# Altium footprint library DrPCB.PcbLib: 910 footprints (part 14 of 57)
Each footprint in its own frame and in the unit in brackets; x right, y up, seen from the top. Pads: shape width x height; smd on the part's side, far side on the other; paste and mask are expansions set on the pad; w line width, h text height; cw(c..) or ccw(c..) is an arc to the next point about the centre after c.
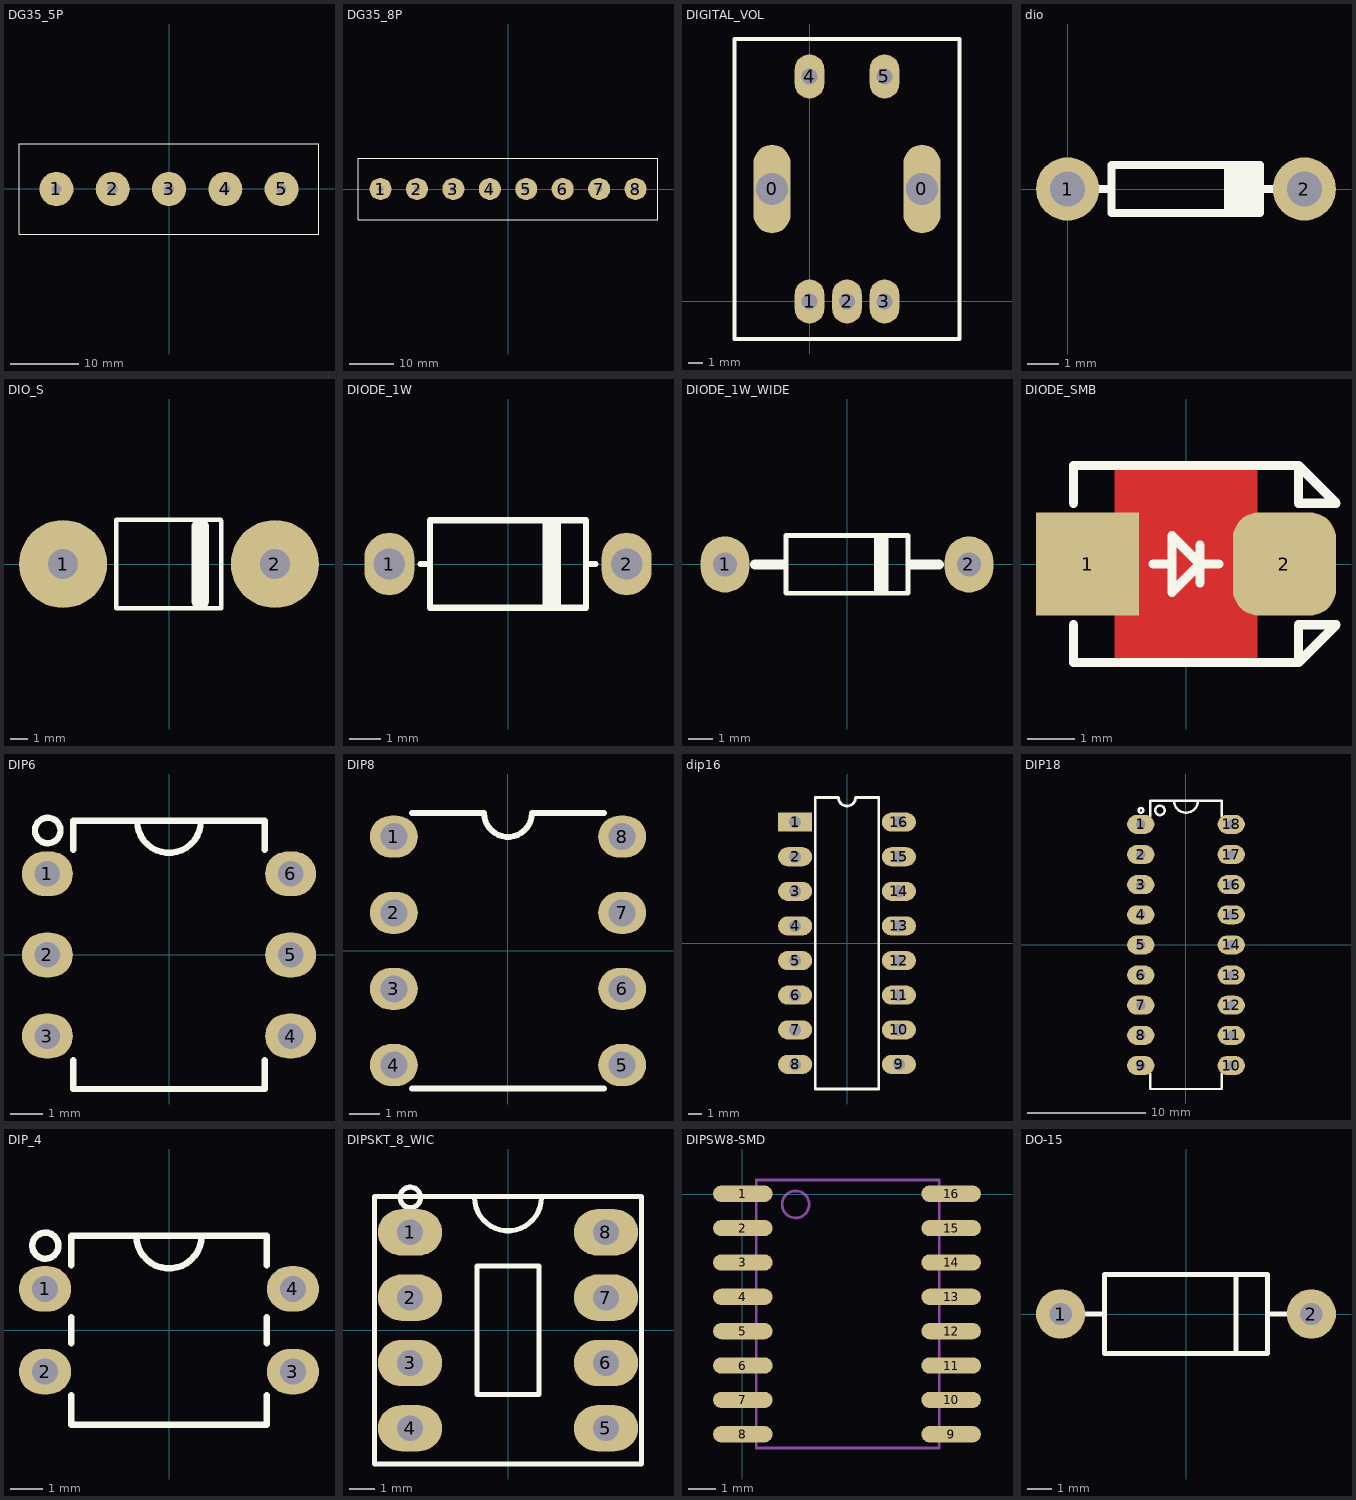
[diagram p13: the footprints below, top view; thin cyan lines are the x and y axes]

## DG35_5P [mm]
pads (5):
  round 5 hole 1.45: 1(-16.5,0) 2(-8.25,0) 3(0,0) 4(8.25,0) 5(16.5,0)
Top Overlay:
  lines w0.15: -21.976,-6.65 21.974,-6.65 21.974,6.642 ; -21.975,-6.65 -21.975,6.642 21.975,6.642
3D body "KF35.STEP": height 14.81, standoff -3.99, extent 3.196,-6.9 21.508,6.9
3D body "KF35.STEP": height 14.81, standoff -3.99, extent -5.054,-6.9 13.258,6.9
3D body "KF35.STEP": height 14.81, standoff -3.99, extent -21.531,-6.9 -3.219,6.9

## DG35_8P [mm]
pads (8):
  round 5 hole 1.45: 1(-28.879,0) 2(-20.629,0) 3(-12.379,0) 4(-4.129,0) 5(4.121,0) 6(12.379,0) 7(20.629,0) 8(28.879,0)
Top Overlay:
  lines w0.15: -33.981,-6.972 33.964,-6.972 33.964,6.985 -33.981,6.985 -33.981,-6.972
3D body "KF35.STEP": height 14.81, standoff -3.99, extent -33.91,-6.9 -15.598,6.9
3D body "KF35.STEP": height 14.81, standoff -3.99, extent -17.433,-6.9 0.88,6.9
3D body "KF35.STEP": height 14.81, standoff -3.99, extent -9.183,-6.9 9.13,6.9
3D body "KF35.STEP": height 14.81, standoff -3.99, extent 15.575,-6.9 33.887,6.9
3D body "KF35.STEP": height 14.81, standoff -3.99, extent -0.902,-6.9 17.41,6.9

## DIGITAL_VOL [mm]
pads (7):
  oval 2.5x6 hole 2.2: 0(-2.54,7.62) 0(7.62,7.62)
  oval 2x3 hole 1.1: 1(0,0) 2(2.54,0) 3(5.08,0) 4(0,15.24) 5(5.08,15.24)
Top Overlay:
  lines w0.254: -5.08,-2.54 -5.08,17.78 10.16,17.78 10.16,-2.54 -5.08,-2.54

## dio [mm]
pads (2):
  round 2 hole 1.1: 1(0,0) 2(7.5,0)
Top Overlay:
  lines w0.254: 0.762,0 1.397,0 1.397,0.762 6.096,0.762 6.096,-0.762 1.397,-0.762 1.397,0.127 ; 5.08,-0.762 5.08,0.762 ; 5.207,-0.762 5.207,0.762 ; 5.334,-0.762 5.334,0.762 ; 5.588,-0.635 5.588,0.762 ; 5.842,0.508 5.842,-0.762 5.842,0.762 ; 6.096,0 6.731,0

## DIO_S [mm]
pads (2):
  round 5 hole 1.7: 1(-6,0) 2(6,0)
Top Overlay:
  lines w0.254: -3,-2.5 2.972,-2.5 2.972,2.462 2.934,2.5 -3,2.5 -3,-2.459
  lines w1: 1.778,-2.095 1.778,2.108

## DIODE_1W [mm] "DIODE 0.3 INCH SPACING 1W, 1N4001"
pads (2):
  oval 1.6x2 hole 1: 1(-3.8,0) 2(3.8,0)
Top Overlay:
  rectangle: 1.1,-1.4 1.7,1.4
  lines w0.2: -2.8,0 -2.5,0 ; 2.5,0 2.8,0 ; -2.5,-1.4 -2.5,1.4 2.5,1.4 2.5,-1.4 -2.5,-1.4
3D body "Zener 1W.STEP": height 3.03, standoff -1.3, extent -4.216,-1.333 4.191,1.334

## DIODE_1W_WIDE [mm] "DIODE 0.3 INCH SPACING 1W, 1N4001"
pads (2):
  oval 2x2.3 hole 1: 1(-5,0) 2(5,0)
Top Overlay:
  rectangle: 1.1,-1.194 1.7,1.232
  lines w0.2: -2.5,-1.181 -2.5,1.194 2.5,1.194 2.5,-1.181 -2.5,-1.181
  lines w0.4: -3.785,0 -2.603,0 ; 2.616,0 3.772,0
3D body "CircuitWorks-DIODE0_4.step": height 2.55, standoff -2.54, extent -5.461,-1.283 5.461,1.283

## DIODE_SMB [mm] "SMB Molded Diode, 2-Leads, Body 4.3x3.5mm"
pads (2):
  rect 2.2x2.2 smd paste-0.1: 1(-2.1,0)
  rrect50% 2.2x2.2 smd paste-0.1: 2(2.1,0)
Top Layer:
  pour cut-out: -1.524,2.1 -1.524,-2.1 1.524,-2.1 1.524,2.1
Top Overlay:
  lines w0.2: -2.4,-1.3 -2.4,-2.1 2.4,-2.1 ; -2.4,1.3 -2.4,2.1 2.4,2.1 ; -0.7,0 -0.3,0 ; 0.3,-0.4 0.3,0.4 ; 0.7,0 0.3,0 ; 0.3,0 -0.3,0.6 -0.3,-0.6 0.3,0 ; 2.4,-2.1 2.4,-1.3 3.2,-1.3 2.4,-2.1 ; 2.4,2.1 3.2,1.3 2.4,1.3 2.4,2.1
3D body "User Library-DIOM5539X24.step": height 2.45, standoff 0.03, extent -2.75,-1.95 2.75,1.95

## DIP6 [mm] "DIP, pitch 2.54mm, 300mil Width"
pads (6):
  oval 1.6x1.4 / inner round 1.4 / far side oval 2.2x1.4 hole 0.8: 1(-3.81,2.54) 2(-3.81,0) 3(-3.81,-2.54) 4(3.81,-2.54) 5(3.81,0) 6(3.81,2.54)
Top Overlay:
  circle w0.2: c-3.8,3.9 r0.4
  lines w0.2: -3,-3.3 -3,-4.2 3,-4.2 3,-3.3 ; -3,3.3 -3,4.2 3,4.2 3,3.3 ; -1,4.2 ccw(c0,4.2) 1,4.2
3D body "CircuitWorks-DIP6.step": height 4.31, standoff -3.28, extent -4,-4.04 4,4.04

## DIP8 [mm]
pads (8):
  oval 1.6x1.4 / inner round 1.4 / far side oval 2.2x1.4 hole 0.9: 1(-3.81,3.81) 2(-3.81,1.27) 3(-3.81,-1.27) 4(-3.81,-3.81) 5(3.81,-3.81) 6(3.81,-1.27) 7(3.81,1.27) 8(3.81,3.81)
Top Overlay:
  lines w0.2: -3.2,-4.6 3.2,-4.6 ; -3.2,4.6 -0.8,4.6 ccw(c0,4.6) 0.8,4.6 3.2,4.6
3D body "User Library-DIP-8P-M01.step": height 4.36, standoff -3, extent -3.935,-4.7 3.935,4.7

## dip16 [mm]
pads (16):
  rect 2.5x1.4 hole 0.9: 1(-3.81,8.89)
  oval 2.5x1.4 hole 0.9: 2(-3.81,6.35) 3(-3.81,3.81) 4(-3.81,1.27) 5(-3.81,-1.27) 6(-3.81,-3.81) 7(-3.81,-6.35) 8(-3.81,-8.89) 9(3.81,-8.89) 10(3.81,-6.35) 11(3.81,-3.81) 12(3.81,-1.27) 13(3.81,1.27) 14(3.81,3.81) 15(3.81,6.35) 16(3.81,8.89)
Top Overlay:
  lines w0.2: -2.337,-10.693 -2.337,10.693 -0.625,10.693 ccw(c0,10.693) 0.625,10.693 2.337,10.693 2.337,-10.693 -2.337,-10.693
3D body "CircuitWorks-DIP16.step": height 4.19, standoff -2.57, extent -3.937,-10.795 3.937,10.795

## DIP18 [mm] "DIP, pitch 2.54mm, 300mil Width"
pads (18):
  oval 2.3x1.6 hole 0.8: 1(-3.81,10.16) 2(-3.81,7.62) 3(-3.81,5.08) 4(-3.81,2.54) 5(-3.81,0) 6(-3.81,-2.54) 7(-3.81,-5.08) 8(-3.81,-7.62) 9(-3.81,-10.16) 10(3.81,-10.16) 11(3.81,-7.62) 12(3.81,-5.08) 13(3.81,-2.54) 14(3.81,0) 15(3.81,2.54) 16(3.81,5.08) 17(3.81,7.62) 18(3.81,10.16)
Top Overlay:
  circle w0.2: c-2.2,11.34 r0.4
  circle w0.2: c-3.8,11.34 r0.2
  lines w0.2: -3,-10.84 -3,-12.14 3,-12.14 3,-10.84 ; -3,10.84 -3,12.14 3,12.14 3,10.84 ; -1,12.14 ccw(c0,12.14) 1,12.14
3D body "User Library-DIP18-300.step": height 5.08, standoff -2.49, extent -3.935,-11.495 3.935,11.495

## DIP_4 [mm] "BRIDGE DIODE, DIP, pitch 2.54mm, 300mil Width"
pads (4):
  oval 1.6x1.4 / inner round 1.4 / far side oval 2.2x1.4 hole 0.8: 1(-3.81,1.27) 2(-3.81,-1.27) 3(3.81,-1.27) 4(3.81,1.27)
Top Overlay:
  circle w0.2: c-3.8,2.6 r0.4
  lines w0.2: -3,-2 -3,-2.9 3,-2.9 3,-2 ; -3,-0.4 -3,0.4 ; -3,2 -3,2.9 3,2.9 3,2 ; -1,2.9 ccw(c0,2.9) 1,2.9 ; 3,-0.4 3,0.4
3D body "CircuitWorks-DIP4.step": height 4.31, standoff -3.28, extent -4,-2.77 4,2.77

## DIPSKT_8_WIC [mm] "SOCKET DIP, pitch 2.54mm, with IC"
pads (8):
  oval 2.5x1.8 hole 1: 1(-3.81,3.81) 2(-3.81,1.27) 3(-3.81,-1.27) 4(-3.81,-3.81) 5(3.81,-3.81) 6(3.81,-1.27) 7(3.81,1.27) 8(3.81,3.81)
Top Overlay:
  circle w0.2: c-3.8,5.17 r0.4
  lines w0.2: -1.3,5.17 ccw(c0,5.17) 1.3,5.17 ; -5.2,-5.2 5.2,-5.2 5.2,5.2 -5.2,5.2 -5.2,-5.2 ; -1.2,-2.5 1.2,-2.5 1.2,2.5 -1.2,2.5 -1.2,-2.5
3D body "User Library-8pin 0_3inch 2_54mm IC DIP Gold Socket.step": height 5, standoff -3, extent -5.06,-5.08 5.1,5.08
3D body "CircuitWorks-DIP8.step": height 8.19, standoff 1.33, extent -3.937,-5.7 3.937,5.73

## DIPSW8-SMD [mm]
pads (16):
  oval 2.2x0.6 smd: 1(0.018,0.026) 2(0.018,-1.244) 3(0.018,-2.514) 4(0.018,-3.784) 5(0.018,-5.054) 6(0.018,-6.324) 7(0.018,-7.594) 8(0.018,-8.864) 9(7.717,-8.864) 10(7.717,-7.594) 11(7.717,-6.324) 12(7.717,-5.054) 13(7.717,-3.784) 14(7.717,-2.514) 15(7.717,-1.244) 16(7.717,0.026)
Mechanical 13:
  circle w0.1: c1.968,-0.369 r0.5
  lines w0.1: 7.264,-9.369 0.518,-9.369 0.518,0.531 7.264,0.531 ; 7.275,-9.369 7.275,0.531
3D body: height 1.75, standoff 0, extent 1.068,-9.372 6.701,0.534

## DO-15 [mm] "DIODE 0.4 INCH SPACING DO-41"
pads (2):
  round 2 hole 0.9: 1(-5.08,0) 2(5.08,0)
Top Overlay:
  lines w0.2: -4.2,0 -3.302,0 ; 2.032,-1.6 2.032,1.6 ; 3.302,0 4.2,0 ; -3.302,-1.6 -3.302,1.6 3.302,1.6 3.302,-1.6 -3.302,-1.6
3D body "User Library-DO-41-4.step": height 2.85, standoff -2.35, extent -5.68,-1.32 5.68,1.4